# Altium footprint library csy.PcbLib: 198 footprints (part 6 of 13)
Each footprint in its own frame and in the unit in brackets; x right, y up, seen from the top. Pads: shape width x height; smd on the part's side, far side on the other; paste and mask are expansions set on the pad; w line width, h text height; cw(c..) or ccw(c..) is an arc to the next point about the centre after c.
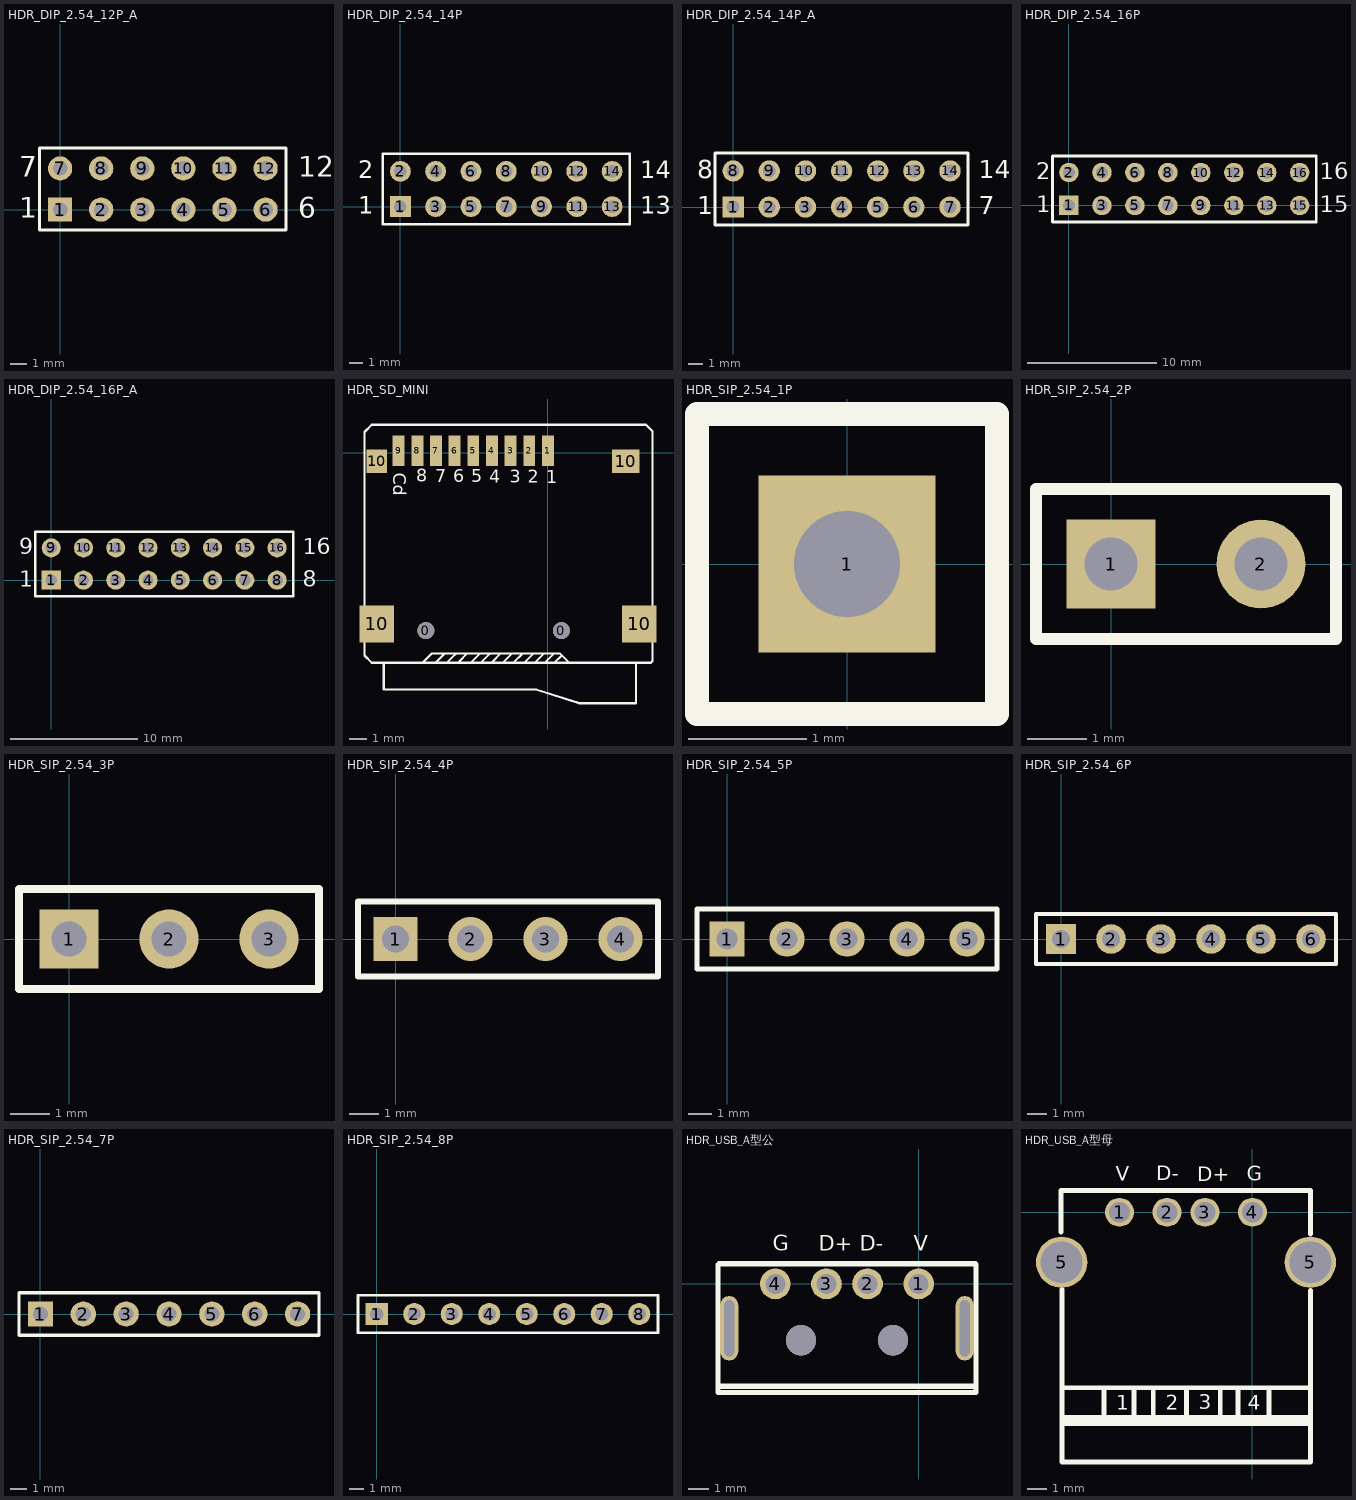
[diagram p5: the footprints below, top view; thin cyan lines are the x and y axes]

## HDR_DIP_2.54_12P_A [mm] "Connector; Header; 6x2 Position"
pads (12):
  rect 1.5x1.5 hole 0.9: 1(0,0)
  round 1.5 hole 0.9: 2(2.54,0) 3(5.08,0) 4(7.62,0) 5(10.16,0) 6(12.7,0) 7(0,2.54) 8(2.54,2.54) 9(5.08,2.54) 10(7.62,2.54) 11(10.16,2.54) 12(12.7,2.54)
Top Overlay:
  lines w0.2: -1.27,-1.27 -1.27,3.81 13.97,3.81 13.97,-1.27 -1.27,-1.27
  text "7" at -2.54,2.032 h1.27
  text "1" at -2.54,-0.508 h1.27
  text "6" at 14.732,-0.508 h1.27
  text "12" at 14.732,2.032 h1.27

## HDR_DIP_2.54_14P [mm] "Connector; Header; 7x2 Position"
pads (14):
  rect 1.5x1.5 hole 0.9: 1(0,0)
  round 1.5 hole 0.9: 2(0,2.54) 3(2.54,0) 4(2.54,2.54) 5(5.08,0) 6(5.08,2.54) 7(7.62,0) 8(7.62,2.54) 9(10.16,0) 10(10.16,2.54) 11(12.7,0) 12(12.7,2.54) 13(15.24,0) 14(15.24,2.54)
Top Overlay:
  lines w0.2: -1.27,-1.27 16.51,-1.27 16.51,3.81 -1.27,3.81 -1.27,-1.27
  text "13" at 17.272,-0.508 h1.27
  text "14" at 17.272,2.032 h1.27
  text "1" at -3.048,-0.508 h1.27
  text "2" at -3.048,2.032 h1.27

## HDR_DIP_2.54_14P_A [mm] "Connector; Header; 7x2 Position"
pads (14):
  rect 1.5x1.5 hole 0.9: 1(0,0)
  round 1.5 hole 0.9: 2(2.54,0) 3(5.08,0) 4(7.62,0) 5(10.16,0) 6(12.7,0) 7(15.24,0) 8(0,2.54) 9(2.54,2.54) 10(5.08,2.54) 11(7.62,2.54) 12(10.16,2.54) 13(12.7,2.54) 14(15.24,2.54)
Top Overlay:
  lines w0.2: -1.27,-1.27 -1.27,3.81 16.51,3.81 16.51,-1.27 -1.27,-1.27
  text "14" at 17.272,2.032 h1.27
  text "7" at 17.272,-0.508 h1.27
  text "1" at -2.54,-0.508 h1.27
  text "8" at -2.54,2.032 h1.27

## HDR_DIP_2.54_16P [mm] "Connector; Header; 8x2 Position"
pads (16):
  rect 1.5x1.5 hole 0.9: 1(0,0)
  round 1.5 hole 0.9: 2(0,2.54) 3(2.54,0) 4(2.54,2.54) 5(5.08,0) 6(5.08,2.54) 7(7.62,0) 8(7.62,2.54) 9(10.16,0) 10(10.16,2.54) 11(12.7,0) 12(12.7,2.54) 13(15.24,0) 14(15.24,2.54) 15(17.78,0) 16(17.78,2.54)
Top Overlay:
  lines w0.2: -1.27,-1.27 19.05,-1.27 19.05,3.81 -1.27,3.81 -1.27,-1.27
  text "16" at 19.304,2.032 h1.27
  text "15" at 19.304,-0.508 h1.27
  text "1" at -2.54,-0.508 h1.27
  text "2" at -2.54,2.032 h1.27

## HDR_DIP_2.54_16P_A [mm] "Connector; Header; 8x2 Position"
pads (16):
  rect 1.5x1.5 hole 0.9: 1(0,0)
  round 1.5 hole 0.9: 2(2.54,0) 3(5.08,0) 4(7.62,0) 5(10.16,0) 6(12.7,0) 7(15.24,0) 8(17.78,0) 9(0,2.54) 10(2.54,2.54) 11(5.08,2.54) 12(7.62,2.54) 13(10.16,2.54) 14(12.7,2.54) 15(15.24,2.54) 16(17.78,2.54)
Top Overlay:
  lines w0.2: -1.27,-1.27 19.05,-1.27 19.05,3.81 -1.27,3.81 -1.27,-1.27
  text "16" at 19.812,2.032 h1.27
  text "8" at 19.812,-0.508 h1.27
  text "1" at -2.54,-0.508 h1.27
  text "9" at -2.54,2.032 h1.27

## HDR_SD_MINI [mm]
pads (15):
  round 1 hole 1 unplated: 0(-7.2,-10.5) 0(0.8,-10.5)
  rect 0.7x1.8 smd: 1(0,0.127) 2(-1.1,0.127) 3(-2.2,0.127) 4(-3.3,0.127) 5(-4.4,0.127) 6(-5.5,0.127) 7(-6.6,0.127) 8(-7.7,0.127) 9(-8.8,0.127)
  rect 2.032x2.2 smd: 10(-10.1,-10.1) 10(5.4,-10.1)
  rect 1.2x1.4 smd: 10(-10.1,-0.5)
  rect 1.6x1.4 smd: 10(4.6,-0.5)
Top Overlay:
  lines w0.127: -9.677,-12.395 -9.677,-13.97 -0.686,-13.97 ; -6.629,-12.395 -6.096,-11.862 -6.096,-11.836 ; -5.969,-12.395 -5.461,-11.887 -5.461,-11.836 ; -5.232,-12.395 -5.232,-12.319 -4.75,-11.836 ; -4.547,-12.395 -3.988,-11.836 -3.962,-11.836 ; -3.962,-12.395 -3.429,-11.862 -3.429,-11.836 ; -3.327,-12.395 -2.769,-11.836 -2.667,-11.836 ; -2.667,-12.395 -2.108,-11.836 -2.083,-11.836 ; -2.032,-12.395 -1.499,-11.862 -1.499,-11.836 ; -1.397,-12.395 -0.838,-11.836 -0.711,-11.836 ; -0.762,-12.395 -0.203,-11.836 -0.178,-11.836 ; -0.711,-13.97 1.854,-14.783 5.207,-14.783 5.207,-12.421 ; -0.178,-12.395 0.381,-11.836 ; 0.381,-12.395 0.787,-11.989 0.864,-11.989 ; -10.389,-12.395 -10.82,-11.963 -10.82,1.219 -10.389,1.651 5.791,1.651 6.172,1.27 6.172,-12.294 6.071,-12.395 ; -10.389,-12.395 6.071,-12.395 ; -10.389,-12.395 -7.391,-12.395 -6.833,-11.836 0.711,-11.836 1.27,-12.395 6.071,-12.395
  text "Cd" at -9.119,-1.168 h0.76
  text "8" at -7.772,-1.727 h0.76
  text "7" at -6.655,-1.753 h0.76
  text "6" at -5.588,-1.753 h0.76
  text "5" at -4.521,-1.753 h0.76
  text "4" at -3.454,-1.778 h0.76
  text "3" at -2.261,-1.778 h0.76
  text "2" at -1.194,-1.778 h0.76
  text "1" at -0.102,-1.803 h0.76
3D body "sdcard.STEP": height 1.8, standoff -0.7, extent -10.372,-14.725 5.901,0.469

## HDR_SIP_2.54_1P [mm] "Connector; Header; 2 Position"
pads (1):
  rect 1.5x1.5 hole 0.9: 1(0,0)
Top Overlay:
  lines w0.2: -1.27,-1.27 -1.27,1.27 1.27,1.27 1.27,-1.27 -1.27,-1.27

## HDR_SIP_2.54_2P [mm] "Connector; Header; 2 Position"
pads (2):
  rect 1.5x1.5 hole 0.9: 1(0,0)
  round 1.5 hole 0.9: 2(2.54,0)
Top Overlay:
  lines w0.2: -1.27,-1.27 3.81,-1.27 3.81,1.27 -1.27,1.27 -1.27,-1.27

## HDR_SIP_2.54_3P [mm] "Connector; Header; 3 Position"
pads (3):
  rect 1.5x1.5 hole 0.9: 1(0,0)
  round 1.5 hole 0.9: 2(2.54,0) 3(5.08,0)
Top Overlay:
  lines w0.2: -1.27,-1.27 -1.27,1.27 6.35,1.27 6.35,-1.27 -1.27,-1.27

## HDR_SIP_2.54_4P [mm] "Connector; Header; 4 Position"
pads (4):
  rect 1.5x1.5 hole 0.9: 1(0,0)
  round 1.5 hole 0.9: 2(2.54,0) 3(5.08,0) 4(7.62,0)
Top Overlay:
  lines w0.2: -1.27,-1.27 -1.27,1.27 8.89,1.27 8.89,-1.27 -1.27,-1.27

## HDR_SIP_2.54_5P [mm] "Connector; Header; 5 Position"
pads (5):
  rect 1.5x1.5 hole 0.9: 1(0,0)
  round 1.5 hole 0.9: 2(2.54,0) 3(5.08,0) 4(7.62,0) 5(10.16,0)
Top Overlay:
  lines w0.2: -1.27,-1.27 -1.27,1.27 11.43,1.27 11.43,-1.27 -1.27,-1.27

## HDR_SIP_2.54_6P [mm] "Connector; Header; 6 Position"
pads (6):
  rect 1.5x1.5 hole 0.9: 1(0,0)
  round 1.5 hole 0.9: 2(2.54,0) 3(5.08,0) 4(7.62,0) 5(10.16,0) 6(12.7,0)
Top Overlay:
  lines w0.2: -1.27,-1.27 13.97,-1.27 13.97,1.27 -1.27,1.27 -1.27,-1.27

## HDR_SIP_2.54_7P [mm] "Connector; Header; 7 Position"
pads (7):
  rect 1.5x1.5 hole 0.9: 1(0,0)
  round 1.5 hole 0.9: 2(2.54,0) 3(5.08,0) 4(7.62,0) 5(10.16,0) 6(12.7,0) 7(15.24,0)
Top Overlay:
  lines w0.2: -1.27,-1.27 -1.27,1.27 16.51,1.27 16.51,-1.27 -1.27,-1.27

## HDR_SIP_2.54_8P [mm] "Connector; Header; 8 Position"
pads (8):
  rect 1.5x1.5 hole 0.9: 1(0,0)
  round 1.5 hole 0.9: 2(2.54,0) 3(5.08,0) 4(7.62,0) 5(10.16,0) 6(12.7,0) 7(15.24,0) 8(17.78,0)
Top Overlay:
  lines w0.2: -1.27,-1.27 -1.27,1.27 19.05,1.27 19.05,-1.27 -1.27,-1.27

## HDR_USB_A型公 [mm]
pads (6):
  round 1.524 hole 1: 1(0,0) 2(-2.54,0) 3(-4.58,0) 4(-7.12,0)
  oval 0.9x3.2 hole 0.5 slot 2.8 at 90 deg: ""(-9.41,-2.2) ""(2.29,-2.2)
via -5.85,-2.8 diameter 1.5 hole 1.5
via -1.27,-2.8 diameter 1.5 hole 1.5
Top Overlay:
  lines w0.254: -9.96,-5.08 2.794,-5.08 ; -9.66,1 2.54,1 ; 2.81,1 -9.922,1 -9.96,0.962 -9.96,0 -9.96,-5.4 -9.66,-5.4 2.54,-5.4 2.84,-5.4 2.84,0 2.84,0.97
  text "D-" at -2.921,1.651 h0.76
  text "D+" at -4.953,1.651 h0.76
  text "G" at -7.239,1.651 h0.76
  text "V" at -0.254,1.651 h0.76
3D body "USB.STEP": height 3.25, standoff -2.95, extent -9.827,-20.073 2.715,0.127

## HDR_USB_A型母 [mm]
pads (6):
  round 1.524 hole 1.1: 1(-7,0) 2(-4.5,0) 3(-2.5,0) 4(0,0)
  round 2.7 hole 2.2: 5(-10.05,-2.635) 5(3.05,-2.635)
Top Overlay:
  lines w0.254: -10.079,-1.041 -10.079,1.143 3.053,1.143 3.053,-1.143 3.053,0.356 ; -10.028,-9.246 3.053,-9.246 ; -10.028,-4.064 -10.028,-13.157 3.053,-13.157 3.053,-4.115 ; -10.002,-11.135 3.053,-11.135 ; -10.002,-10.922 3.053,-10.922 ; -9.875,-10.795 3.053,-10.795 ; -7.818,-10.795 -7.818,-9.246 ; -6.243,-10.795 -6.243,-9.322 ; -5.227,-10.82 -5.227,-9.271 ; -3.475,-10.795 -3.475,-9.322 ; -1.697,-10.897 -1.697,-9.271 ; -0.757,-10.871 -0.757,-9.271 ; 0.869,-10.998 0.869,-9.296
  text "V" at -7.188,1.651 h0.76
  text "G" at -0.305,1.651 h0.76
  text "1" at -7.163,-10.414 h0.76
  text "2" at -4.572,-10.414 h0.76
  text "3" at -2.819,-10.389 h0.76
  text "4" at -0.254,-10.414 h0.76
  text "D+" at -2.896,1.626 h0.76
  text "D-" at -5.08,1.676 h0.76
3D body "Samtec-USBR-A-S-S-O-TH.STEP": height 1.9, standoff -8.95, extent -11.202,-12.979 4.598,1.181